# Altium footprint library Footprints_SOC.PcbLib: 197 footprints (part 5 of 13)
Each footprint in its own frame and in the unit in brackets; x right, y up, seen from the top. Pads: shape width x height; smd on the part's side, far side on the other; paste and mask are expansions set on the pad; w line width, h text height; cw(c..) or ccw(c..) is an arc to the next point about the centre after c.
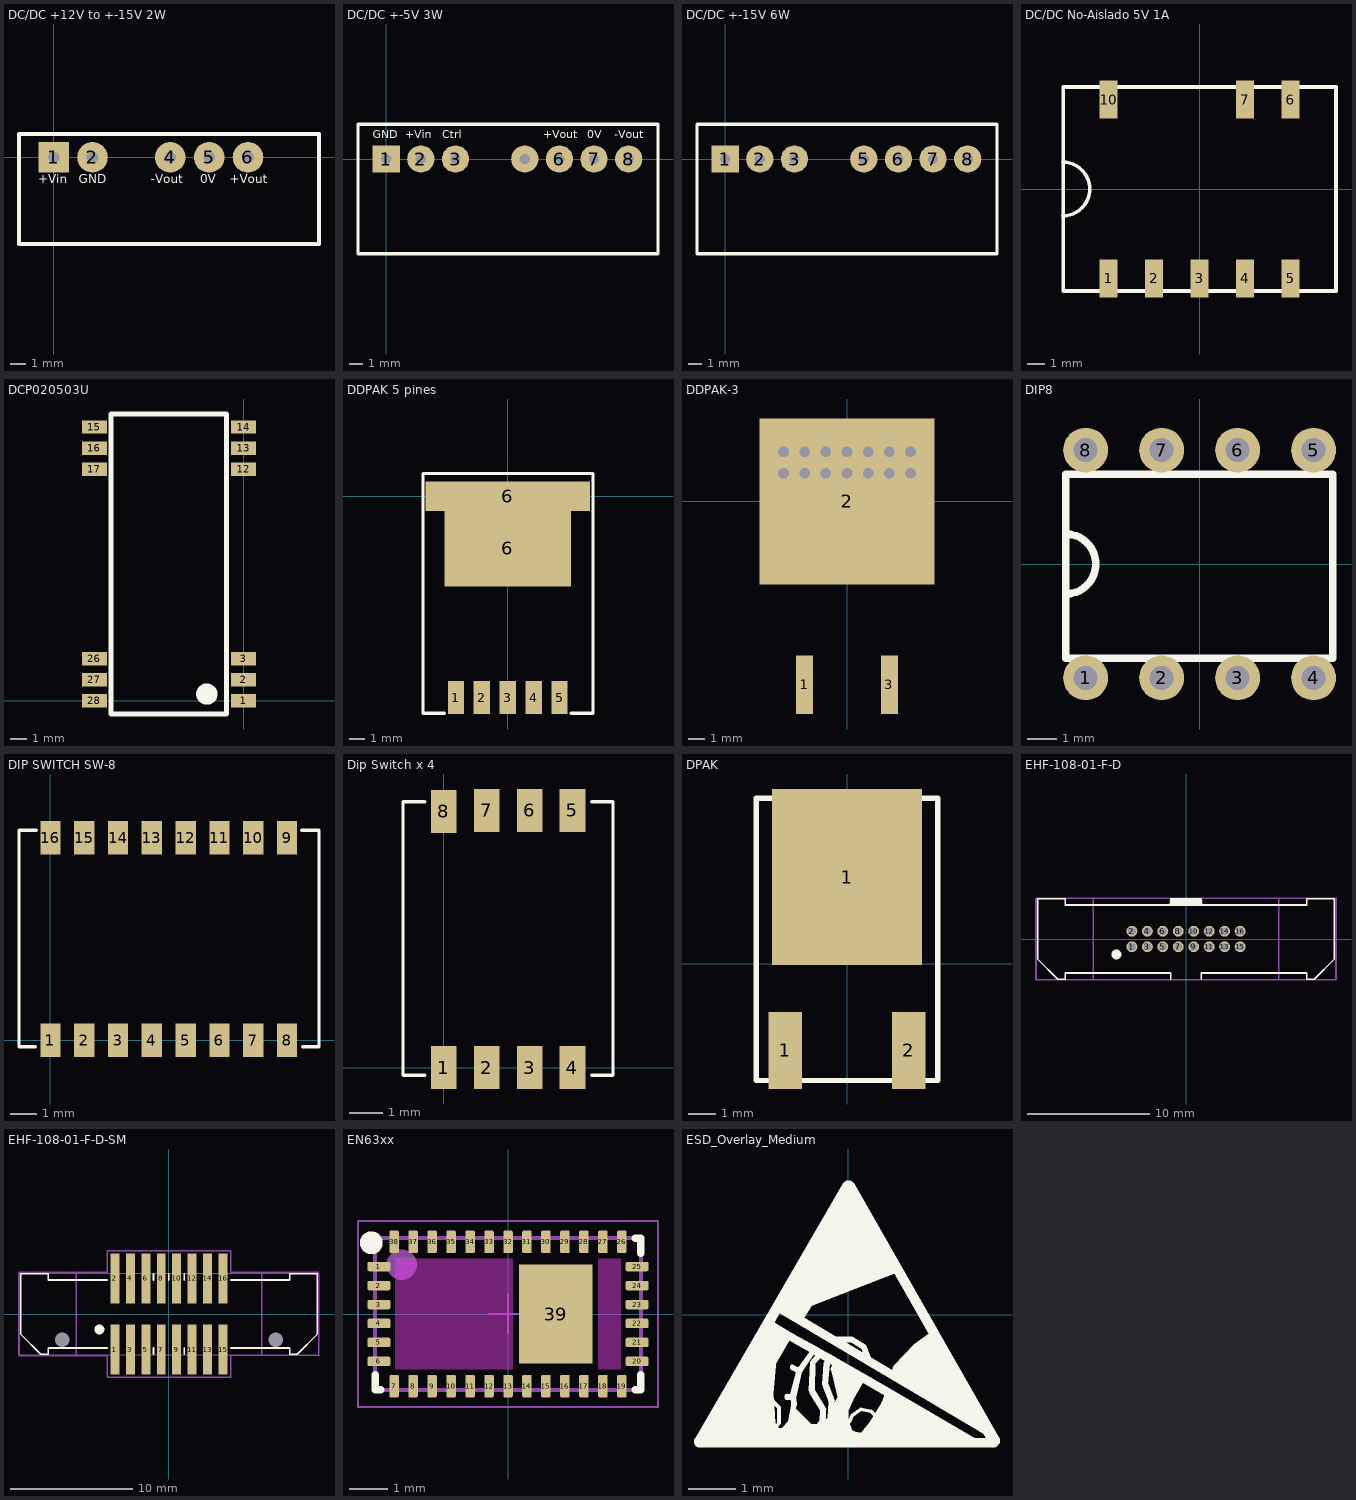
[diagram p4: the footprints below, top view; thin cyan lines are the x and y axes]

## DC/DC +12V to +-15V 2W [mm] "Marca CUI INC (regulado)"
pads (5):
  rect 2x2 hole 0.762: 1(0,0)
  round 2 hole 0.762: 2(2.54,0) 4(7.62,0) 5(10.16,0) 6(12.7,0)
Top Overlay:
  lines w0.254: -2.26,-5.66 -2.26,1.53 17.34,1.53 17.34,-5.66 -2.26,-5.66
  text "0V" at 9.57,-1.892 h1
  text "+Vout" at 11.5,-1.89 h1
  text "+Vin" at -1.01,-1.89 h1
  text "GND" at 1.63,-1.901 h1
  text "-Vout" at 6.35,-1.89 h1
3D body "CUI_PCN2-S12-D15-S.step": height 10.2, standoff -4.1, extent -2.26,-5.67 17.34,1.53

## DC/DC +-5V 3W [mm] "Marca CUI INC (regulado)"
pads (7):
  rect 2x2 hole 0.762: 1(0,0)
  round 2 hole 0.762: 2(2.54,0) 3(5.08,0) 6(12.7,0) 7(15.24,0) 8(17.78,0) ""(10.16,0)
Top Overlay:
  lines w0.254: -2.07,-6.95 19.93,-6.95 19.93,2.55 -2.07,2.55 -2.07,-6.95
  text "GND" at -0.98,1.32 h1
  text "+Vin" at 1.41,1.308 h1
  text "+Vout" at 11.5,1.32 h1
  text "-Vout" at 16.71,1.32 h1
  text "0V" at 14.74,1.32 h1
  text "Ctrl" at 4.1,1.32 h1
3D body "CUI_PQMC3-D5-D5-S.step": height 12.3, standoff -3.8, extent -2.07,-6.95 19.93,2.55

## DC/DC +-15V 6W [mm] "Marca MEAN WELL (DPBW06F-15)"
pads (7):
  rect 2x2 hole 0.762: 1(0,0)
  round 2 hole 0.762: 2(2.54,0) 3(5.08,0) 5(10.16,0) 6(12.7,0) 7(15.24,0) 8(17.78,0)
Top Overlay:
  lines w0.254: -2.07,-6.95 19.93,-6.95 19.93,2.55 -2.07,2.55 -2.07,-6.95
3D body "CUI_PQMC3-D5-D5-S.step": height 12.3, standoff -3.8, extent -2.07,-6.95 19.93,2.55

## DC/DC No-Aislado 5V 1A [mm] "CUI Inc. P/N: V78E05-1000-SMT-TR"
pads (8):
  rect 1x2.1 smd: 1(-5.08,-5) 2(-2.54,-5) 3(0,-5) 4(2.54,-5) 5(5.08,-5) 6(5.08,5) 7(2.54,5) 10(-5.08,5)
Top Overlay:
  lines w0.2: -7.64,-1.5 ccw(c-7.64,0) -7.64,1.5 ; -7.62,-5.7 -7.62,5.7 7.62,5.7 7.62,-5.7 -7.62,-5.7
3D body "DC-DC CUI_V78E05-1000-SMT-TR.step": height 8.3, standoff 0.05, extent -7.62,-5.7 7.62,5.7

## DCP020503U [mm] "IC REG ISOLATED IN:5V OUT:3.3V"
pads (12):
  rect 1.5x0.8 smd: 1(0,0) 2(0,1.27) 3(0,2.54) 12(0,13.97) 13(0,15.24) 14(0,16.51) 15(-9,16.51) 16(-9,15.24) 17(-9,13.97) 26(-9,2.54) 27(-9,1.27) 28(-9,0)
Top Overlay:
  circle w0.65: c-2.216,0.4 r0.316
  lines w0.3: -8,-0.8 -1.03,-0.8 -1.03,17.3 -8,17.3 -8,-0.8
3D body: height 2.65, standoff 0.3, extent -8.15,-0.95 -0.88,17.45

## DDPAK 5 pines [mm] "5 lead"
pads (7):
  rect 1.07x2.16 smd: 1(-3.4,-13.215) 2(-1.7,-13.215) 3(0,-13.215) 4(1.7,-13.215) 5(3.4,-13.215)
  rect 8.33x5.08 smd: 6(0,-3.4)
  rect 10.8x1.91 smd: 6(0,0)
Top Overlay:
  lines w0.2: -4.16,-14.245 -5.57,-14.245 -5.57,1.5 5.6,1.5 5.6,-14.245 4.15,-14.245
3D body "TO-263BA.stp": height 4.8, standoff 0, extent -5.31,-14.245 5.333,1.605

## DDPAK-3 [mm]
pads (3):
  rect 1.016x3.504 smd: 1(-2.54,-11) 3(2.54,-11)
  rect 10.49x9.94 smd: 2(0,0)
via -2.54,2.97 diameter 1.3 hole 0.635
via -1.27,2.97 diameter 1.3 hole 0.635
via 0,2.97 diameter 1.3 hole 0.635
via 1.27,2.97 diameter 1.3 hole 0.635
via 2.54,2.97 diameter 1.3 hole 0.635
via 3.81,2.97 diameter 1.3 hole 0.635
via 3.81,1.7 diameter 1.3 hole 0.635
via 2.54,1.7 diameter 1.3 hole 0.635
via 1.27,1.7 diameter 1.3 hole 0.635
via 0,1.7 diameter 1.3 hole 0.635
via -1.27,1.7 diameter 1.3 hole 0.635
via -2.54,1.7 diameter 1.3 hole 0.635
via -3.81,1.7 diameter 1.3 hole 0.635
via -3.81,2.97 diameter 1.3 hole 0.635
3D body "TO-263AB.stp": height 4.8, standoff 0, extent -5.313,-11.67 5.33,4.18

## DIP8 [mm]
pads (8):
  round 1.5 hole 0.8: 1(-3.81,-3.81) 2(-1.27,-3.81) 3(1.27,-3.81) 4(3.81,-3.81) 5(3.81,3.81) 6(1.27,3.81) 7(-1.27,3.81) 8(-3.81,3.81)
Top Overlay:
  lines w0.254: -4.47,-1 ccw(c-4.47,0) -4.47,1 ; -4.47,-3.15 -4.47,3 4.45,3 4.45,-3.15 -4.47,-3.15
3D body "DIP8 Through Hole.STEP": height 3.85, standoff -2, extent -4.6,-3.935 4.6,3.935

## DIP SWITCH SW-8 [mm] "Pitch 1.27mm 8 switches"
pads (16):
  rect 0.76x1.27 smd: 1(0,0) 2(1.27,0) 3(2.54,0) 4(3.81,0) 5(5.08,0) 6(6.35,0) 7(7.62,0) 8(8.89,0) 9(8.89,7.6) 10(7.62,7.6) 11(6.35,7.6) 12(5.08,7.6) 13(3.81,7.6) 14(2.54,7.6) 15(1.27,7.6) 16(0,7.6)
Top Overlay:
  lines w0.127: -0.57,-0.25 -1.18,-0.25 -1.18,7.88 -0.53,7.88 ; 9.44,7.88 10.09,7.88 10.09,-0.25 9.48,-0.25
3D body "dip switch 8 interruptores smd 1.27mm pitch.stp": height 2.35, standoff 0.04, extent -1.179,-0.254 10.099,7.874

## Dip Switch x 4 [mm]
pads (8):
  rect 0.76x1.27 smd: 1(0,0) 2(1.27,0) 3(2.54,0) 4(3.81,0) 5(3.81,7.62) 6(2.54,7.62) 7(1.27,7.62) 8(0,7.59)
Top Overlay:
  lines w0.1: -0.56,-0.23 -1.21,-0.23 -1.21,7.88 -0.56,7.88 ; 4.38,-0.23 5.01,-0.23 5.01,7.88 4.38,7.88
3D body "dip-switchx4.stp": height 2.3, standoff -0.01, extent -1.219,-0.244 4.979,7.884

## DPAK [mm] "TO-252; SC-63"
pads (3):
  rect 1.25x2.85 smd: 1(-2.28,-3.2) 2(2.28,-3.2)
  rect 5.55x6.5 smd: 1(0,3.2)
Top Overlay:
  lines w0.2: -3.356,-4.31 -3.356,6.104 3.356,6.104 3.356,-4.31 -3.356,-4.31
3D body "TO-252AA-Vishay.stp": height 2.39, standoff 0, extent -3.356,-4.31 3.356,6.104

## EHF-108-01-F-D [mm]
pads (16):
  round 0.9 hole 0.65: 1(-4.445,-0.635) 2(-4.445,0.635) 3(-3.175,-0.635) 4(-3.175,0.635) 5(-1.905,-0.635) 6(-1.905,0.635) 7(-0.635,-0.635) 8(-0.635,0.635) 9(0.635,-0.635) 10(0.635,0.635) 11(1.905,-0.635) 12(1.905,0.635) 13(3.175,-0.635) 14(3.175,0.635) 15(4.445,-0.635) 16(4.445,0.635)
Top Overlay:
  circle w0.406: c-5.715,-1.27 r0.203
  lines w0.127: -1.27,-3.302 -1.27,-2.794 -9.906,-2.794 -9.906,-3.302 -10.541,-3.302 -12.192,-1.651 -12.192,-1.524 -12.192,3.302 -9.906,3.302 -9.906,2.794 -1.27,2.794 ; 1.27,-3.302 1.27,-2.794 9.906,-2.794 9.906,-3.302 10.541,-3.302 12.192,-1.651 12.192,3.302 9.906,3.302 9.906,2.794 1.27,2.794 ; -1.27,2.794 -1.27,3.302 1.27,3.302 1.27,2.794 ; -1.27,2.794 1.27,2.794
  lines w0.14: -1.27,2.921 1.27,2.921 ; -1.27,3.048 1.27,3.048 ; -1.27,3.175 1.27,3.175
Mechanical 5:
  lines w0.127: -7.62,-3.302 -7.62,3.302 ; 7.62,-3.302 7.62,3.302 ; -12.319,-3.353 12.319,-3.353 12.319,3.353 -12.319,3.353 -12.319,-3.353
  text ".Designator" at -5.207,-0.254 h1.52
Mechanical 15:
  lines w0.051: -12.319,-3.353 12.319,-3.353 12.319,3.353 -12.319,3.353 -12.319,-3.353
3D body "EHF-108-01-F-D.stp": height 11.3, standoff -2.72, extent -12.319,-3.34 12.319,3.34

## EHF-108-01-F-D-SM [mil]
pads (18):
  rect 29x161 smd: 1(-175,-115) 2(-175,115) 3(-125,-115) 4(-125,115) 5(-75,-115) 6(-75,115) 7(-25,-115) 8(-25,115) 9(25,-115) 10(25,115) 11(75,-115) 12(75,115) 13(125,-115) 14(125,115) 15(175,-115) 16(175,115)
  round 43.31 hole 47 unplated: ""(-345,-83) ""(345,-83)
Top Overlay:
  circle w16: c-225,-50 r8
  lines w5: -200,-110 -390,-110 -390,-130 -415,-130 -480,-65 -480,-60 -480,130 -390,130 -390,110 -200,110 ; -50,-130 -50,-110 ; -50,110 -50,130 ; 0,110 0,130 ; 50,-130 50,-110 ; 50,110 50,130 ; 200,-110 390,-110 390,-130 415,-130 480,-65 480,130 390,130 390,110 200,110
Mechanical 5:
  lines w5: -485,-135 -200,-135 -200,-205 200,-205 200,-135 201.63,-133.37 485.16,-133.37 ; -485,-132 -485,132 ; -485,135 -200,135 -200,205 200,205 200,135 485,135 ; -300,-130 -300,130 ; 300,-130 300,130 ; 485,-132 485,132
  text ".Designator" at -205,-10.01 h60
Mechanical 15:
  lines w2: -485,-132 485,-132 485,132 -485,132 -485,-132
3D body "EHF-108-01-F-D-SM.stp": height 445, standoff -10, extent -484.99,-148 485,148

## EN63xx [mm]
height 1.9
pads (39):
  rrect33% 0.6x0.25 smd: 1(-3.4,1.25) 2(-3.4,0.75) 3(-3.4,0.25) 4(-3.4,-0.25) 5(-3.4,-0.75) 6(-3.4,-1.25) 20(3.4,-1.25) 21(3.4,-0.75) 22(3.4,-0.25) 23(3.4,0.25) 24(3.4,0.75) 25(3.4,1.25)
  rrect33% 0.25x0.6 smd: 7(-3,-1.9) 8(-2.5,-1.9) 9(-2,-1.9) 10(-1.5,-1.9) 11(-1,-1.9) 12(-0.5,-1.9) 13(0,-1.9) 14(0.5,-1.9) 15(1,-1.9) 16(1.5,-1.9) 17(2,-1.9) 18(2.5,-1.9) 19(3,-1.9) 26(3,1.9) 27(2.5,1.9) 28(2,1.9) 29(1.5,1.9) 30(1,1.9) 31(0.5,1.9) 32(0,1.9) 33(-0.5,1.9) 34(-1,1.9) 35(-1.5,1.9) 36(-2,1.9) 37(-2.5,1.9) 38(-3,1.9)
  rect 1.94x2.6 smd: 39(1.255,0)
Top Layer keep-out:
  region: 2.975,1.45 2.975,-1.45 2.375,-1.45 2.375,1.45
  region: -2.975,1.45 -2.975,-1.45 0.125,-1.45 0.125,1.45
Top Overlay:
  circle w0.3: c-3.6,1.875 r0.15
  lines w0.2: -3.5,-1.6 -3.5,-2 -3.35,-2 ; 3.35,-2 3.5,-2 3.5,-1.6 ; 3.35,2 3.5,2 3.5,1.6
Mechanical 13:
  circle w0.4: c-2.8,1.3 r0.2
  lines w0.1: -3.5,-2 -3.5,2 3.5,2 3.5,-2 -3.5,-2
  text ".Designator" at 0.25,-0.833 h1
Mechanical 15:
  lines w0.05: -0.5,0 0.5,0 ; 0,-0.5 0,0.5 ; -3.95,-2.45 -3.95,2.45 3.95,2.45 3.95,-2.45 -3.95,-2.45
3D body: height 1.9, standoff 0, extent -3.5,-2 3.5,2
3D body: height 1.91, standoff 0, extent -3.098,1.001 -2.5,1.6

## ESD_Overlay_Medium [mm]
height 11.303
Top Overlay:
  drawing of 6916 lines, arcs and shapes, not listed

## Fibra Optica Panel [mm]
3D body: height -2.05, standoff -19.35, extent 0.838,0.533 11.838,11.533
3D body: height 14.75, standoff 2.05, extent 0.833,0.49 11.833,11.487
3D body: height 4.1, standoff -2.05, extent 0.806,0.357 11.855,11.533